# Altium footprint library 3.22-杂项.PcbLib: 985 footprints (part 25 of 64)
Each footprint in its own frame and in the unit in brackets; x right, y up, seen from the top. Pads: shape width x height; smd on the part's side, far side on the other; paste and mask are expansions set on the pad; w line width, h text height; cw(c..) or ccw(c..) is an arc to the next point about the centre after c.
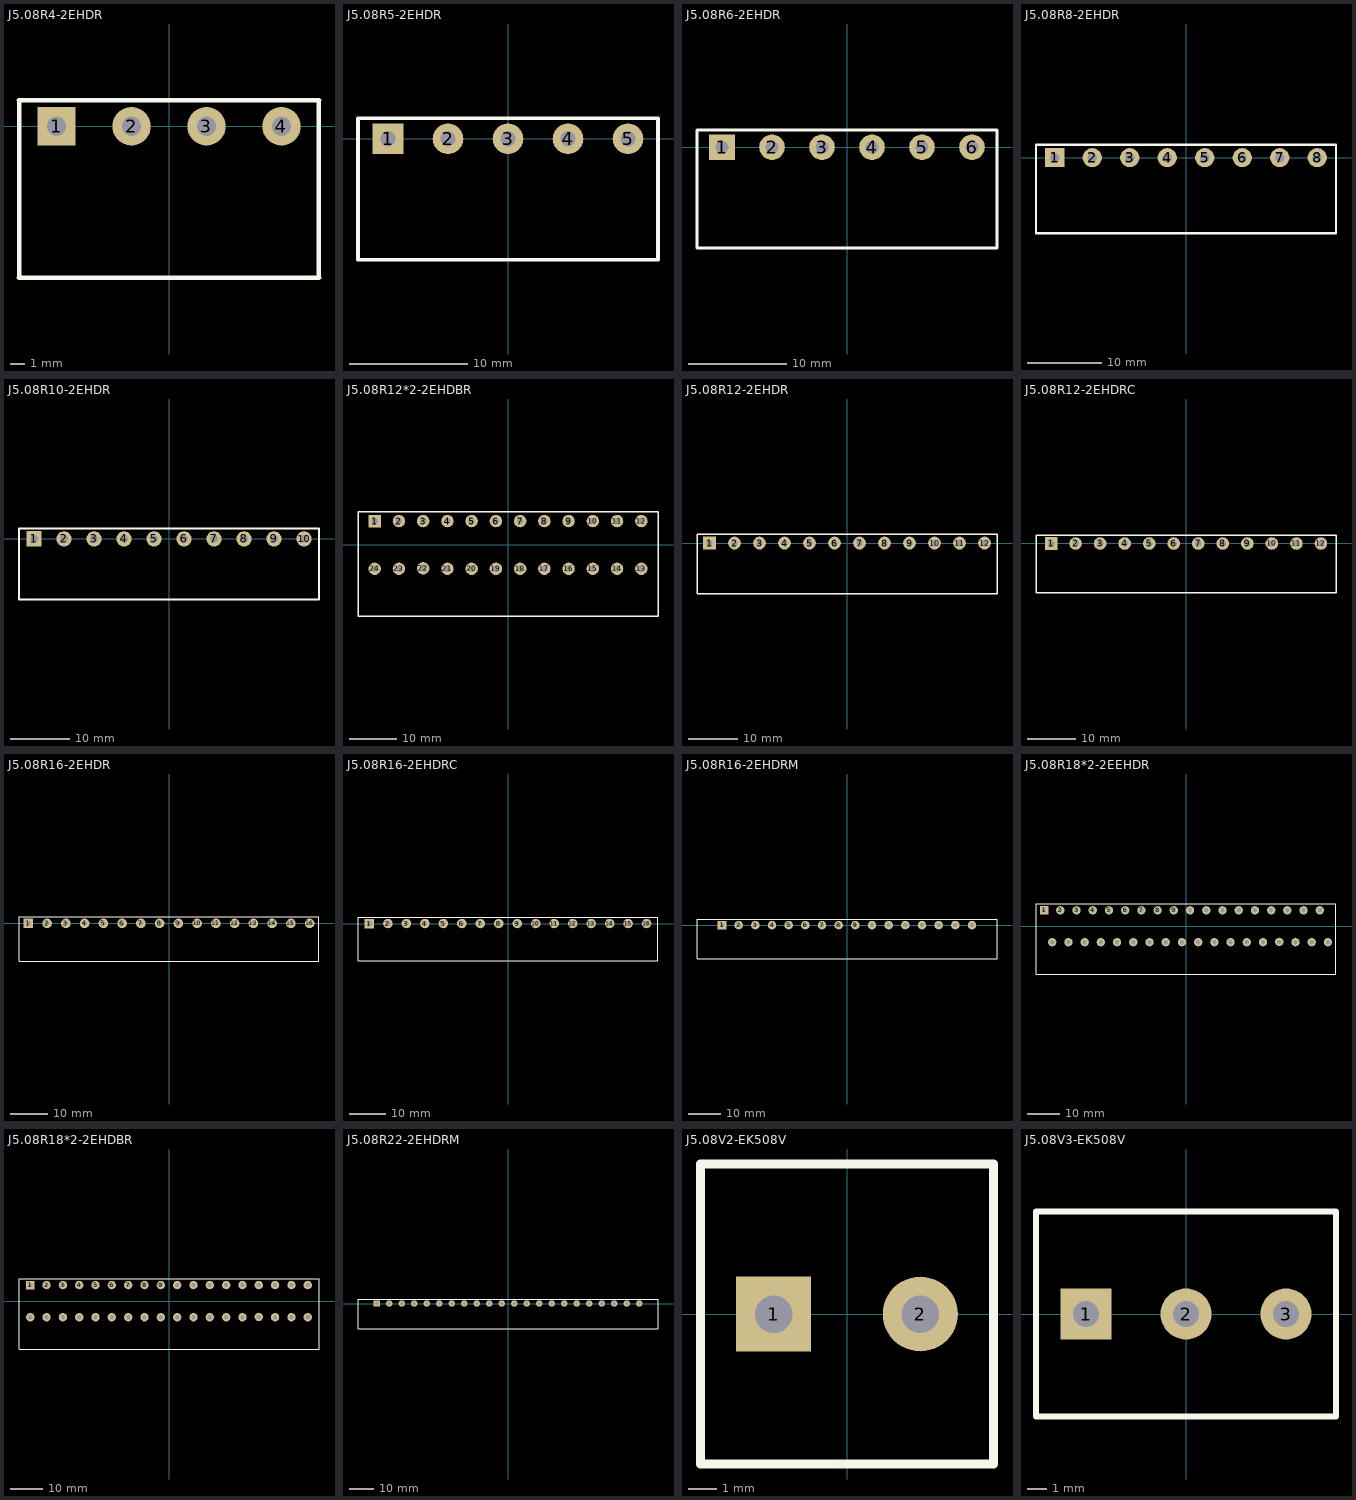
[diagram p24: the footprints below, top view; thin cyan lines are the x and y axes]

## J5.08R4-2EHDR [mm] "5.08弯脚R，单排可插拔，4芯，两边开口"
height 8.32
pads (4):
  rect 2.6x2.6 hole 1.3: 1(-7.62,0)
  round 2.6 hole 1.3: 2(-2.54,0) 3(2.54,0) 4(7.62,0)
Top Overlay:
  lines w0.305: -10.16,-10.25 10.16,-10.25 10.16,1.75 -10.16,1.75 -10.16,-10.25

## J5.08R5-2EHDR [mm] "5.08弯脚R，单排可插拔，5芯，两边开口"
height 8.32
pads (5):
  rect 2.6x2.6 hole 1.3: 1(-10.16,0)
  round 2.6 hole 1.3: 2(-5.08,0) 3(0,0) 4(5.08,0) 5(10.16,0)
Top Overlay:
  lines w0.305: -12.7,-10.25 12.7,-10.25 12.7,1.75 -12.7,1.75 -12.7,-10.25

## J5.08R6-2EHDR [mm] "5.08弯脚R，单排可插拔，6芯，两边开口"
height 8.32
pads (6):
  rect 2.6x2.6 hole 1.3: 1(-12.7,0)
  round 2.6 hole 1.3: 2(-7.62,0) 3(-2.54,0) 4(2.54,0) 5(7.62,0) 6(12.7,0)
Top Overlay:
  lines w0.305: -15.24,-10.25 -15.24,1.75 15.24,1.75 15.24,-10.25 -15.24,-10.25

## J5.08R8-2EHDR [mm] "5.08弯脚R，单排可插拔，8芯，两边开口"
height 8.32
pads (8):
  rect 2.6x2.6 hole 1.3: 1(-17.78,0)
  round 2.6 hole 1.3: 2(-12.7,0) 3(-7.62,0) 4(-2.54,0) 5(2.54,0) 6(7.62,0) 7(12.7,0) 8(17.78,0)
Top Overlay:
  lines w0.305: -20.32,-10.25 20.32,-10.25 20.32,1.75 -20.32,1.75 -20.32,-10.25

## J5.08R10-2EHDR [mm] "5.08弯脚R，单排可插拔，10芯，两边开口"
height 8.32
pads (10):
  rect 2.6x2.6 hole 1.3: 1(-22.86,0)
  round 2.6 hole 1.3: 2(-17.78,0) 3(-12.7,0) 4(-7.62,0) 5(-2.54,0) 6(2.54,0) 7(7.62,0) 8(12.7,0) 9(17.78,0) 10(22.86,0)
Top Overlay:
  lines w0.305: -25.4,-10.25 25.4,-10.25 25.4,1.75 -25.4,1.75 -25.4,-10.25

## J5.08R12*2-2EHDBR [mm] "5.08弯脚R，双排可插拔，12芯*2"
height 28.4
pads (24):
  rect 2.6x2.6 hole 1.3: 1(-27.94,5)
  round 2.6 hole 1.3: 2(-22.86,5) 3(-17.78,5) 4(-12.7,5) 5(-7.62,5) 6(-2.54,5) 7(2.54,5) 8(7.62,5) 9(12.7,5) 10(17.78,5) 11(22.86,5) 12(27.94,5) 13(27.94,-5) 14(22.86,-5) 15(17.78,-5) 16(12.7,-5) 17(7.62,-5) 18(2.54,-5) 19(-2.54,-5) 20(-7.62,-5) 21(-12.7,-5) 22(-17.78,-4.906) 23(-22.86,-5) 24(-27.94,-5)
Top Overlay:
  lines w0.305: -31.44,-15 -31.44,7 31.44,7 31.44,-15 -31.44,-15

## J5.08R12-2EHDR [mm] "5.08弯脚R，单排可插拔，12芯，两边开口"
height 8.32
pads (12):
  rect 2.6x2.6 hole 1.3: 1(-27.94,0)
  round 2.6 hole 1.3: 2(-22.86,0) 3(-17.78,0) 4(-12.7,0) 5(-7.62,0) 6(-2.54,0) 7(2.54,0) 8(7.62,0) 9(12.7,0) 10(17.78,0) 11(22.86,0) 12(27.94,0)
Top Overlay:
  lines w0.305: -30.48,-10.25 30.48,-10.25 30.48,1.75 -30.48,1.75 -30.48,-10.25

## J5.08R12-2EHDRC [mm] "5.08弯脚R，单排可插拔，12芯，两边封口"
height 8.32
pads (12):
  rect 2.6x2.6 hole 1.3: 1(-27.94,0)
  round 2.6 hole 1.3: 2(-22.86,0) 3(-17.78,0) 4(-12.7,0) 5(-7.62,0) 6(-2.54,0) 7(2.54,0) 8(7.62,0) 9(12.7,0) 10(17.78,0) 11(22.86,0) 12(27.94,0)
Top Overlay:
  lines w0.305: -31.08,-10.25 -31.08,1.75 31.08,1.75 31.08,-10.25 -31.08,-10.25

## J5.08R16-2EHDR [mm] "5.08弯脚R，单排可插拔，16芯，两边开口"
height 8.32
pads (16):
  rect 2.6x2.6 hole 1.3: 1(-38.1,0)
  round 2.6 hole 1.3: 2(-33.02,0) 3(-27.94,0) 4(-22.86,0) 5(-17.78,0) 6(-12.7,0) 7(-7.62,0) 8(-2.54,0) 9(2.54,0) 10(7.62,0) 11(12.7,0) 12(17.78,0) 13(22.86,0) 14(27.94,0) 15(33.02,0) 16(38.1,0)
Top Overlay:
  lines w0.305: -40.64,-10.25 -40.64,1.75 40.64,1.75 40.64,-10.25 -40.64,-10.25

## J5.08R16-2EHDRC [mm] "5.08弯脚R，单排可插拔，16芯，两边封口"
height 8.32
pads (16):
  rect 2.6x2.6 hole 1.3: 1(-38.1,0)
  round 2.6 hole 1.3: 2(-33.02,0) 3(-27.94,0) 4(-22.86,0) 5(-17.78,0) 6(-12.7,0) 7(-7.62,0) 8(-2.54,0) 9(2.54,0) 10(7.62,0) 11(12.7,0) 12(17.78,0) 13(22.86,0) 14(27.94,0) 15(33.02,0) 16(38.1,0)
Top Overlay:
  lines w0.305: -41.24,-10.25 41.24,-10.25 41.24,1.75 -41.24,1.75 -41.24,-10.25

## J5.08R16-2EHDRM [mm] "5.08弯脚R，单排可插拔，16芯，两边螺丝"
pads (16):
  rect 2.6x2.6 hole 1.3: 1(-38.1,0)
  round 2.6 hole 1.3: 2(-33.02,0) 3(-27.94,0) 4(-22.86,0) 5(-17.78,0) 6(-12.7,0) 7(-7.62,0) 8(-2.54,0) 9(2.54,0) 10(7.62,0) 11(12.7,0) 12(17.78,0) 13(22.86,0) 14(27.94,0) 15(33.02,0) 16(38.1,0)
Top Overlay:
  lines w0.305: -45.72,-10.25 45.72,-10.25 45.72,1.75 -45.72,1.75 -45.72,-10.25

## J5.08R18*2-2EEHDR [mm] "5.08弯脚R，双排可插拔，18芯*2"
height 23.5
pads (36):
  rect 2.6x2.6 hole 1.3: 1(-44.45,5)
  round 2.6 hole 1.3: 2(-39.37,5) 3(-34.29,5) 4(-29.21,5) 5(-24.13,5) 6(-19.05,5) 7(-13.97,5) 8(-8.89,5) 9(-3.81,5) 10(1.27,5) 11(6.35,5) 12(11.43,5) 13(16.51,5) 14(21.59,5) 15(26.67,5) 16(31.75,5) 17(36.83,5) 18(41.91,5) 19(44.45,-5) 20(39.37,-5) 21(34.29,-5) 22(29.21,-4.906) 23(24.13,-5) 24(19.05,-5) 25(13.97,-5) 26(8.89,-5) 27(3.81,-5) 28(-1.27,-5) 29(-6.35,-5) 30(-11.43,-5) 31(-16.51,-5) 32(-21.59,-5) 33(-26.67,-5) 34(-31.75,-5) 35(-36.83,-5) 36(-41.91,-5)
Top Overlay:
  lines w0.305: -46.99,-15 46.99,-15 46.99,7 -46.99,7 -46.99,-15

## J5.08R18*2-2EHDBR [mm] "5.08弯脚R，双排可插拔，18芯*2"
height 28.4
pads (36):
  rect 2.6x2.6 hole 1.3: 1(-43.18,5)
  round 2.6 hole 1.3: 2(-38.1,5) 3(-33.02,5) 4(-27.94,5) 5(-22.86,5) 6(-17.78,5) 7(-12.7,5) 8(-7.62,5) 9(-2.54,5) 10(2.54,5) 11(7.62,5) 12(12.7,5) 13(17.78,5) 14(22.86,5) 15(27.94,5) 16(33.02,5) 17(38.1,5) 18(43.18,5) 19(43.18,-5) 20(38.1,-5) 21(33.02,-5) 22(27.94,-4.906) 23(22.86,-5) 24(17.78,-5) 25(12.7,-5) 26(7.62,-5) 27(2.54,-5) 28(-2.54,-5) 29(-7.62,-5) 30(-12.7,-5) 31(-17.78,-5) 32(-22.86,-5) 33(-27.94,-5) 34(-33.02,-5) 35(-38.1,-5) 36(-43.18,-5)
Top Overlay:
  lines w0.305: -46.68,-15 -46.68,7 46.68,7 46.68,-15 -46.68,-15

## J5.08R22-2EHDRM [mm] "5.08弯脚R，单排可插拔，22芯，两边螺丝"
pads (22):
  rect 2.6x2.6 hole 1.3: 1(-53.34,0)
  round 2.6 hole 1.3: 2(-48.26,0) 3(-43.18,0) 4(-38.1,0) 5(-33.02,0) 6(-27.94,0) 7(-22.86,0) 8(-17.78,0) 9(-12.7,0) 10(-7.62,0) 11(-2.54,0) 12(2.54,0) 13(7.62,0) 14(12.7,0) 15(17.78,0) 16(22.86,0) 17(27.94,0) 18(33.02,0) 19(38.1,0) 20(43.18,0) 21(48.26,0) 22(53.34,0)
Top Overlay:
  lines w0.305: -60.96,-10.25 -60.96,1.75 60.96,1.75 60.96,-10.25 -60.96,-10.25

## J5.08V2-EK508V [mm] "5mm间距2芯方针，直径1.3mm，垂直方向一字镙丝,宽10mm"
pads (2):
  rect 2.6x2.6 hole 1.3: 1(-2.54,0)
  round 2.6 hole 1.3: 2(2.54,0)
Top Overlay:
  lines w0.305: -5.08,-5.2 5.08,-5.2 5.08,5.2 -5.08,5.2 -5.08,-5.2

## J5.08V3-EK508V [mm] "5mm间距3芯方针，直径1.3mm，垂直方向一字镙丝,宽10mm"
pads (3):
  rect 2.6x2.6 hole 1.3: 1(-5.08,0)
  round 2.6 hole 1.3: 2(0,0) 3(5.08,0)
Top Overlay:
  lines w0.305: -7.62,-5.2 7.62,-5.2 7.62,5.2 -7.62,5.2 -7.62,-5.2